# Altium footprint library DIP Connector.PcbLib: 69 footprints (part 2 of 5)
Each footprint in its own frame and in the unit in brackets; x right, y up, seen from the top. Pads: shape width x height; smd on the part's side, far side on the other; paste and mask are expansions set on the pad; w line width, h text height; cw(c..) or ccw(c..) is an arc to the next point about the centre after c.
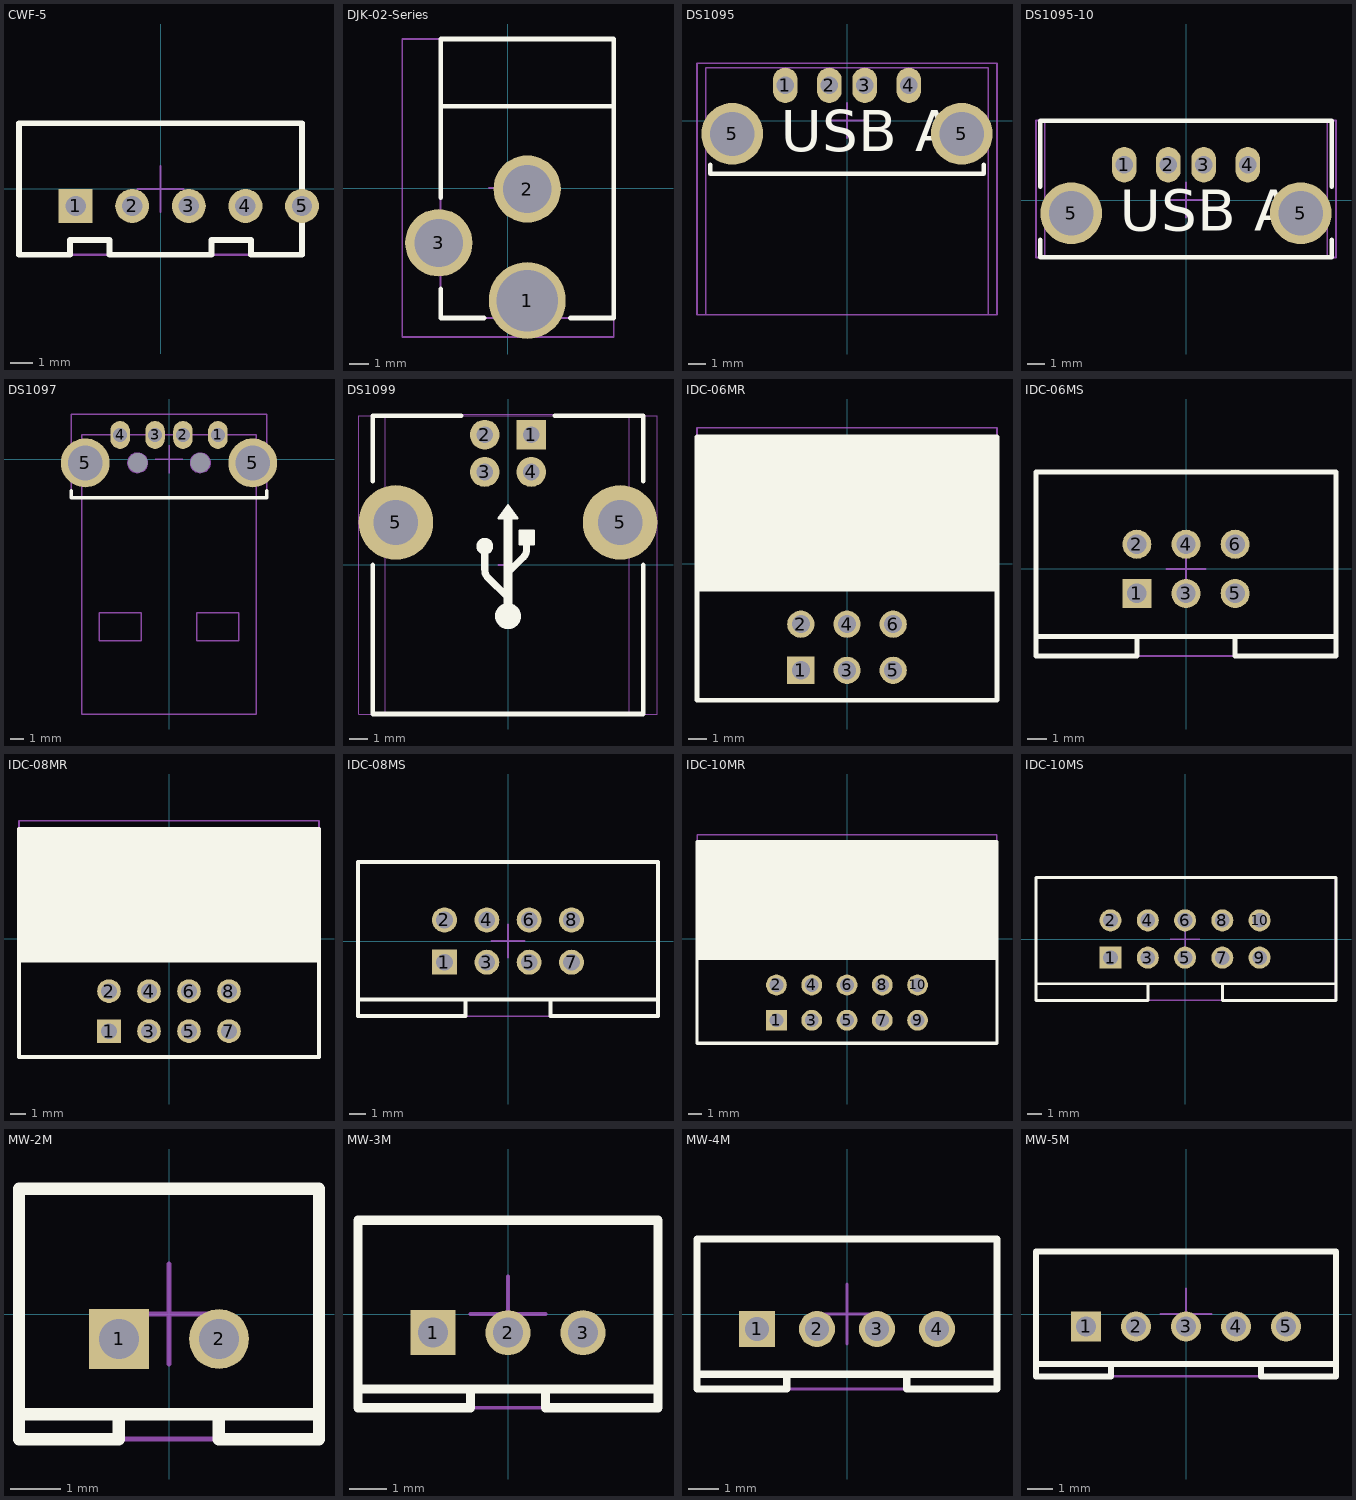
[diagram p1: the footprints below, top view; thin cyan lines are the x and y axes]

## CWF-5 [mm]
height 7.7
pads (5):
  rect 1.5x1.5 hole 0.9: 1(-3.75,-0.75)
  round 1.5 hole 0.9: 2(-1.25,-0.75) 3(1.25,-0.75) 4(3.75,-0.75) 5(6.25,-0.75)
Top Overlay:
  lines w0.25: -6.25,-2.9 -4,-2.9 -4,-2.25 -2.25,-2.25 -2.25,-2.9 2.25,-2.9 2.25,-2.25 4,-2.25 4,-2.9 6.25,-2.9 6.25,2.9 -6.25,2.9 -6.25,-2.9
Mechanical 13:
  lines w0.1: -6.25,-2.9 -6.25,2.9 6.25,2.9 6.25,-2.9 4,-2.9 4,-2.25 2.25,-2.25 2.25,-2.9 -2.25,-2.9 -2.25,-2.25 -4,-2.25 -4,-2.9 -6.25,-2.9
  text "Not Ready!" at -0.75,0 h1.52
Mechanical 15:
  lines w0.1: -1,0 1,0 ; 0,-1 0,1 ; -6.25,-2.9 -6.25,2.9 6.25,2.9 6.25,-2.9 -6.25,-2.9
3D body "User Library-CWF-5.step": height 7.2, standoff -3.3, extent -6.2,-2.9 8.8,2.85

## DJK-02-Series [mm]
height 11
pads (3):
  round 4 hole 3.2: 1(1,-5.85)
  round 3.5 hole 2.5: 2(1,-0.05) 3(-3.6,-2.85)
Top Overlay:
  lines w0.25: -3.5,-5.25 -3.5,-6.75 -1.25,-6.75 ; -3.5,-0.5 -3.5,7.75 5.5,7.75 5.5,-6.75 3.25,-6.75 ; -3.5,4.25 5.5,4.25
Mechanical 13:
  lines w0.1: -3.5,4.25 5.5,4.25 ; -3.5,-6.75 5.5,-6.75 5.5,7.75 -3.5,7.75 -3.5,-6.75
Mechanical 15:
  lines w0.1: -1,0 1,0 ; 0,-1 0,1 ; -5.5,-7.75 -5.5,7.75 5.5,7.75 5.5,-7.75 -5.5,-7.75
3D body "User Library-DJK-02A-1.step": height 11.5, standoff -3, extent -3.95,-6.75 5.5,7.75

## DS1095 [mm]
height 7.1
pads (6):
  oval 1.4x2 hole 1: 1(-3.5,2) 2(-1,2) 3(1,2) 4(3.5,2)
  round 3.5 hole 2.5: 5(-6.5,-0.75) 5(6.5,-0.75)
Top Overlay:
  lines w0.25: -7.75,-2.5 -7.75,-3 7.75,-3 7.75,-2.5
  text "USB A" at -3.75,-2.5 h4
Mechanical 13:
  lines w0.1: -8,-11 8,-11 8,3 -8,3 -8,-11
Mechanical 15:
  lines w0.1: -1,0 1,0 ; 0,-1 0,1 ; -8.5,-11 -8.5,3.25 8.5,3.25 8.5,-11 -8.5,-11
3D body "292303-1.STEP": height 7.66, standoff -3.62, extent -8.117,-10.99 8.117,3.01

## DS1095-10 [mm]
height 15
pads (6):
  oval 1.4x2 hole 1: 1(-3.5,2) 2(-1,2) 3(1,2) 4(3.5,2)
  round 3.5 hole 2.5: 5(-6.5,-0.75) 5(6.5,-0.75)
Top Overlay:
  lines w0.25: -8.25,-2.25 -8.25,-3.25 8.25,-3.25 8.25,-2.25 ; -8.25,0.75 -8.25,4.5 8.25,4.5 8.25,0.75
  text "USB A" at -3.75,-2.5 h4
Mechanical 13:
  lines w0.1: -8,-3.25 8,-3.25 8,4.5 -8,4.5 -8,-3.25
Mechanical 15:
  lines w0.1: -1,0 1,0 ; 0,-1 0,1 ; -8.5,-3.25 -8.5,4.5 8.5,4.5 8.5,-3.25 -8.5,-3.25
3D body "usb_a-usb_a-top-c.stp": height 14, standoff -3.8, extent -7.991,-3.19 7.992,4.45

## DS1097 [mm]
height 4.5
pads (8):
  round 0 hole 1.4: 0(-2.25,-0.25) 0(2.25,-0.25)
  oval 1.4x2 hole 1: 1(3.5,1.75) 2(1,1.75) 3(-1,1.75) 4(-3.5,1.75)
  round 3.5 hole 2.5: 5(-6,-0.25) 5(6,-0.25)
Top Overlay:
  lines w0.25: -7,-2.25 -7,-2.75 7,-2.75 7,-2.25
Mechanical 13:
  circle w0.1: c-2.25,-0.25 r0.7
  circle w0.1: c2.25,-0.25 r0.7
  lines w0.1: -6.25,-2.75 6.25,-2.75 ; -4,1.75 -4,2 -3,2 -3,1.75 ; -1.25,1.75 -1.25,2 -0.75,2 -0.75,1.75 ; 0.75,1.75 0.75,2 1.25,2 1.25,1.75 ; 3,1.75 3,2 4,2 4,1.75 ; -6.25,-18.25 6.25,-18.25 6.25,1.75 -6.25,1.75 -6.25,-18.25 ; -5,-13 -5,-11 -2,-11 -2,-13 -5,-13 ; 2,-13 5,-13 5,-11 2,-11 2,-13
Mechanical 15:
  lines w0.1: -1,0 1,0 ; 0,-1 0,1 ; -7,-2.75 -7,3.25 7,3.25 7,-2.75 -7,-2.75
3D body "usb_a-usb_a-lp-c.stp": height 3.3, standoff -2.5, extent -6.303,-17.925 6.303,2

## DS1099 [mm]
height 11.1
pads (6):
  rect 1.6x1.6 hole 0.9: 1(1.25,6.99)
  round 1.6 hole 0.9: 2(-1.25,6.99) 3(-1.25,4.99) 4(1.25,4.99)
  round 4 hole 2.4: 5(-6.02,2.28) 5(6.02,2.28)
Top Overlay:
  circle w0.889: c0,-2.75 r0.254
  circle w0.508: c-1.25,1 r0.2
  region: 0,3.2 0.5,2.5 -0.5,2.5
  region: 1.375,1.85 1.375,1.1 0.625,1.1 0.625,1.85
  lines w0.127: -0.5,2.5 0,3.2 0.5,2.5 -0.5,2.5 ; 0.625,1.1 0.625,1.85 1.375,1.85 1.375,1.1 0.625,1.1
  lines w0.25: -7.25,0 -7.25,-8 7.25,-8 7.25,0 ; -7.25,4.5 -7.25,8 -2.5,8 ; 2.5,8 7.25,8 7.25,4.5
  lines w0.381: -1.25,1 -1.25,-0.25 ccw(c-0.61,-0.25) -1.062,-0.703 -0.062,-1.703 ; 0.062,-0.353 0.812,0.397 ccw(c0.36,0.85) 1,0.85 1,1.1
  lines w0.508: 0,-2.25 0,2.5
Mechanical 13:
  lines w0.05: -6.6,-7.9 6.5,-7.9 6.5,8.1 -6.6,8.1 -6.6,-7.9
Mechanical 15:
  lines w0.05: -7.999,-8 -7.999,8 8,8 8,-8 -7.999,-8
  lines w0.1: -0.504,0 0.496,0 ; -0.004,-0.5 -0.004,0.5
3D body "61729-0010BLF.STEP": height 11, standoff -2.8, extent -6.6,-7.87 6.52,8.07

## IDC-06MR [mm]
height 8.7
pads (6):
  rect 1.5x1.5 hole 1: 1(-2.54,-5.85)
  round 1.5 hole 1: 2(-2.54,-3.31) 3(0,-5.85) 4(0,-3.31) 5(2.54,-5.85) 6(2.54,-3.31)
Top Overlay:
  rectangle: -8.255,-1.5 8.255,7
  lines w0.25: -8.255,-7.5 8.255,-7.5 8.255,7 -8.255,7 -8.255,-7.5
Mechanical 15:
  lines w0.1: -1,0 1,0 ; 0,-1 0,1 ; -8.255,-7.5 8.255,-7.5 8.255,7.5 -8.255,7.5 -8.255,-7.5
3D body "User Library-IDC Socket Male 6pin Angled THT Goldplated 2_54mm.step": height 8.98, standoff -2.37, extent -7.93,-6.35 7.93,7.21

## IDC-06MS [mm]
height 8.7
pads (6):
  rect 1.5x1.5 hole 1: 1(-2.54,-1.27)
  round 1.5 hole 1: 2(-2.54,1.27) 3(0,-1.27) 4(0,1.27) 5(2.54,-1.27) 6(2.54,1.27)
Top Overlay:
  lines w0.25: -7.75,-3.5 7.75,-3.5 ; -2.54,-3.5 -2.54,-4.5 -7.75,-4.5 -7.75,5 7.75,5 7.75,-4.5 2.54,-4.5 2.54,-3.5
Mechanical 15:
  lines w0.1: -1,0 1,0 ; 0,-1 0,1 ; -7.75,-4.5 -7.75,5 7.75,5 7.75,-4.5 -7.75,-4.5
3D body "User Library-Header2x3-shrouded-vertical.step": height 9.1, standoff -3.1, extent -7.62,-4.425 7.62,5.025

## IDC-08MR [mm]
height 8.7
pads (8):
  rect 1.5x1.5 hole 1: 1(-3.81,-5.85)
  round 1.5 hole 1: 2(-3.81,-3.31) 3(-1.27,-5.85) 4(-1.27,-3.31) 5(1.27,-5.85) 6(1.27,-3.31) 7(3.81,-5.85) 8(3.81,-3.31)
Top Overlay:
  rectangle: -9.525,-1.5 9.525,7
  lines w0.25: -9.525,-7.5 -9.525,7 9.525,7 9.525,-7.5 -9.525,-7.5
Mechanical 15:
  lines w0.1: -1,0 1,0 ; 0,-1 0,1 ; -9.525,-7.5 -9.525,7.5 9.525,7.5 9.525,-7.5 -9.525,-7.5
3D body "User Library-IDC Socket Male 8pin Angled THT Goldplated 2_54mm.step": height 8.98, standoff -2.37, extent -9.2,-6.25 9.2,7.31

## IDC-08MS [mm]
height 8.7
pads (8):
  rect 1.5x1.5 hole 1: 1(-3.81,-1.27)
  round 1.5 hole 1: 2(-3.81,1.27) 3(-1.27,-1.27) 4(-1.27,1.27) 5(1.27,-1.27) 6(1.27,1.27) 7(3.81,-1.27) 8(3.81,1.27)
Top Overlay:
  lines w0.25: -9,-3.5 9,-3.5 ; -2.54,-3.5 -2.54,-4.5 -9,-4.5 -9,4.75 9,4.75 9,-4.5 2.54,-4.5 2.54,-3.5
Mechanical 15:
  lines w0.1: -1,0 1,0 ; 0,-1 0,1 ; -9,-4.5 9,-4.5 9,4.75 -9,4.75 -9,-4.5
3D body "User Library-8 pin IDC shrouded header V2.step": height 9.48, standoff -2.67, extent -8.865,-4.475 8.915,4.725

## IDC-10MR [mm]
height 8.7
pads (10):
  rect 1.5x1.5 hole 1: 1(-5.08,-5.85)
  round 1.5 hole 1: 2(-5.08,-3.31) 3(-2.54,-5.85) 4(-2.54,-3.31) 5(0,-5.85) 6(0,-3.31) 7(2.54,-5.85) 8(2.54,-3.31) 9(5.08,-5.85) 10(5.08,-3.31)
Top Overlay:
  rectangle: -10.795,-1.5 10.795,7
  lines w0.25: -10.795,-7.5 -10.795,7 10.795,7 10.795,-7.5 -10.795,-7.5
Mechanical 15:
  lines w0.1: -1,0 1,0 ; 0,-1 0,1 ; -10.795,-7.5 -10.795,7.5 10.795,7.5 10.795,-7.5 -10.795,-7.5
3D body "User Library-IDC Socket Male 10pin Angled THT Goldplated 2_54mm.step": height 8.98, standoff -2.37, extent -10.47,-6.25 10.47,7.31

## IDC-10MS [mm]
height 8.7
pads (10):
  rect 1.5x1.5 hole 1: 1(-5.08,-1.27)
  round 1.5 hole 1: 2(-5.08,1.27) 3(-2.54,-1.27) 4(-2.54,1.27) 5(0,-1.27) 6(0,1.27) 7(2.54,-1.27) 8(2.54,1.27) 9(5.08,-1.27) 10(5.08,1.27)
Top Overlay:
  lines w0.2: -10.16,-3.048 10.287,-3.048 ; -2.54,-3.048 -2.54,-4.191 -10.16,-4.191 -10.16,4.191 10.287,4.191 10.287,-4.191 2.54,-4.191 2.54,-3.048
Mechanical 7:
  lines w0.05: -10.16,-4.191 -10.16,4.191 10.25,4.191 10.25,-4.191 -10.16,-4.191
  text ".Designator" at -1.25,2.75 h1
  text "1" at -7.5,-1.75 h1
Mechanical 15:
  lines w0.1: -1,0 1,0 ; 0,-1 0,1 ; -10.16,-4.191 -10.16,4.191 10.25,4.191 10.25,-4.191 -10.16,-4.191
3D body "IDC-10MS.STEP": height 9.3, standoff -2.79, extent -10.14,-4.2 10.16,4.2

## MW-2M [mm]
height 6
pads (2):
  rect 1.2x1.2 hole 0.8: 1(-1,-0.5)
  round 1.2 hole 0.8: 2(1,-0.5)
Top Overlay:
  lines w0.25: -3,-2 3,-2 ; -1,-2 -1,-2.5 -3,-2.5 -3,2.5 3,2.5 3,-2.5 1,-2.5 1,-2
Mechanical 13:
  lines w0.1: -3,-2 3,-2 ; -1,-2 -1,-2.5 -3,-2.5 -3,2.5 3,2.5 3,-2.5 1,-2.5 1,-2
Mechanical 15:
  lines w0.1: -1,0 1,0 ; 0,-1 0,1 ; -3,-2.5 -3,2.5 3,2.5 3,-2.5 -3,-2.5

## MW-3M [mm]
height 6
pads (3):
  rect 1.2x1.2 hole 0.8: 1(-2,-0.5)
  round 1.2 hole 0.8: 2(0,-0.5) 3(2,-0.5)
Top Overlay:
  lines w0.25: -4,-2 4,-2 ; -1,-2 -1,-2.5 -4,-2.5 -4,2.5 4,2.5 4,-2.5 1,-2.5 1,-2
Mechanical 13:
  lines w0.1: -4,-2 4,-2 ; -1,-2 -1,-2.5 -4,-2.5 -4,2.5 4,2.5 4,-2.5 1,-2.5 1,-2
Mechanical 15:
  lines w0.1: -1,0 1,0 ; 0,-1 0,1 ; -4,-2.5 4,-2.5 4,2.5 -4,2.5 -4,-2.5

## MW-4M [mm]
height 6
pads (4):
  rect 1.2x1.2 hole 0.8: 1(-3,-0.5)
  round 1.2 hole 0.8: 2(-1,-0.5) 3(1,-0.5) 4(3,-0.5)
Top Overlay:
  lines w0.25: -5,-2 5,-2 ; -2,-2 -2,-2.5 -5,-2.5 -5,2.5 5,2.5 5,-2.5 2,-2.5 2,-2
Mechanical 13:
  lines w0.1: -5,-2 5,-2 ; -2,-2 -2,-2.5 -5,-2.5 -5,2.5 5,2.5 5,-2.5 2,-2.5 2,-2
Mechanical 15:
  lines w0.1: -1,0 1,0 ; 0,-1 0,1 ; -5,-2.5 5,-2.5 5,2.5 -5,2.5 -5,-2.5

## MW-5M [mm]
height 6
pads (5):
  rect 1.2x1.2 hole 0.8: 1(-4,-0.5)
  round 1.2 hole 0.8: 2(-2,-0.5) 3(0,-0.5) 4(2,-0.5) 5(4,-0.5)
Top Overlay:
  lines w0.25: -6,-2 6,-2 ; -3,-2 -3,-2.5 -6,-2.5 -6,2.5 6,2.5 6,-2.5 3,-2.5 3,-2
Mechanical 13:
  lines w0.1: -6,-2 6,-2 ; -3,-2 -3,-2.5 -6,-2.5 -6,2.5 6,2.5 6,-2.5 3,-2.5 3,-2
Mechanical 15:
  lines w0.1: -1,0 1,0 ; 0,-1 0,1 ; -6,-2.5 6,-2.5 6,2.5 -6,2.5 -6,-2.5
3D body "B5B-PH-K.STEP": height 6.1, standoff -3.3, extent -5.95,-2.25 5.95,2.25